# Altium footprint library Hare_Library.PcbLib: 252 footprints (part 14 of 16)
Each footprint in its own frame and in the unit in brackets; x right, y up, seen from the top. Pads: shape width x height; smd on the part's side, far side on the other; paste and mask are expansions set on the pad; w line width, h text height; cw(c..) or ccw(c..) is an arc to the next point about the centre after c.
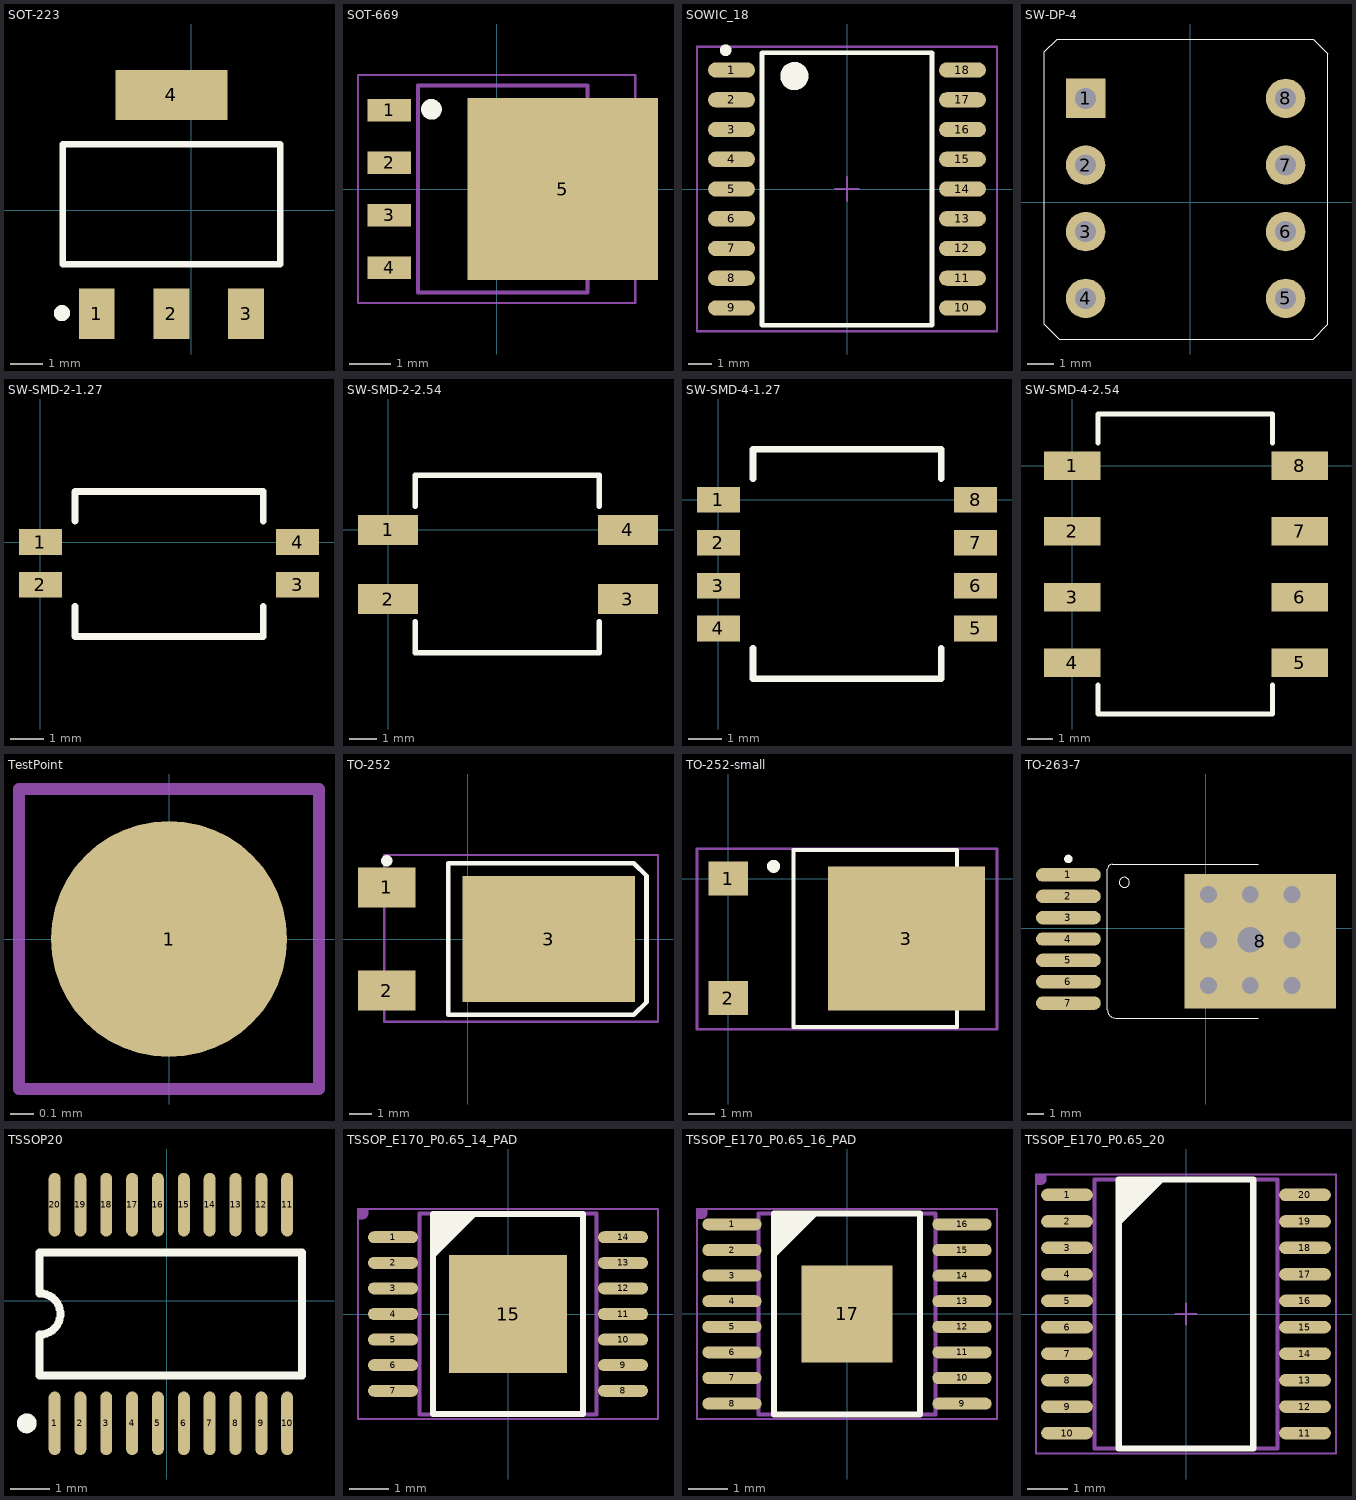
[diagram p13: the footprints below, top view; thin cyan lines are the x and y axes]

## SOT-223 [mm]
pads (4):
  rect 1.1x1.55 smd: 1(-2.91,-3.197) 2(-0.61,-3.197) 3(1.69,-3.197)
  rect 3.45x1.55 smd: 4(-0.61,3.553)
Top Overlay:
  circle w0.25: c-3.986,-3.175 r0.125
  lines w0.2: -3.96,-1.672 -3.96,2.028 2.74,2.028 2.74,-1.672 -3.96,-1.672
3D body "CircuitWorks-SOT-223.SLDPRT": height 1.7, standoff 0.02, extent -3.885,-3.378 2.615,3.582

## SOT-669 [mm] "DPAK, 4-Leads, Body 5x4.1mm, Pitch 1.27mm, IPC Medium Density"
height 1.2
pads (5):
  rect 1.05x0.55 smd: 1(-2.6,1.905) 2(-2.6,0.635) 3(-2.6,-0.635) 4(-2.6,-1.905)
  rect 4.6x4.4 smd: 5(1.6,0)
Top Overlay:
  circle w0.25: c-1.575,1.925 r0.125
Mechanical 13:
  lines w0.1: -1.9,-2.5 2.2,-2.5 2.2,2.5 -1.9,2.5 -1.9,-2.5
Mechanical 15:
  lines w0.05: -3.35,-2.75 3.35,-2.75 3.35,2.75 -3.35,2.75 -3.35,-2.75
  lines w0.1: -0.5,0 0.5,0 ; 0,-0.5 0,0.5
3D body "SOT669-CW.step": height 1.15, standoff -0.05, extent -2.878,-2.45 3.55,2.45

## SOWIC_18 [mm]
pads (18):
  oval 2x0.65 smd: 1(-4.933,5.08) 2(-4.933,3.81) 3(-4.933,2.54) 4(-4.933,1.27) 5(-4.933,0) 6(-4.933,-1.27) 7(-4.933,-2.54) 8(-4.933,-3.81) 9(-4.933,-5.08) 10(4.933,-5.08) 11(4.933,-3.81) 12(4.933,-2.54) 13(4.933,-1.27) 14(4.933,0) 15(4.933,1.27) 16(4.933,2.54) 17(4.933,3.81) 18(4.933,5.08)
Top Overlay:
  circle w0.6: c-2.25,4.825 r0.3
  circle w0.25: c-5.183,5.93 r0.125
  lines w0.2: -3.632,-5.825 -3.632,5.825 3.632,5.825 3.632,-5.825 -3.632,-5.825
Mechanical 15:
  lines w0.1: -0.5,0 0.5,0 ; 0,-0.5 0,0.5 ; -6.408,-6.075 -6.408,6.075 6.408,6.075 6.408,-6.075 -6.408,-6.075
3D body "SOIC-18-300.STEP": height 2.57, standoff -0.03, extent -5.3,-5.875 5.3,5.875

## SW-DP-4 [mm]
pads (8):
  rect 1.5x1.5 hole 0.8: 1(-3.98,3.96)
  round 1.5 hole 0.8: 2(-3.98,1.42) 3(-3.98,-1.12) 4(-3.98,-3.66) 5(3.64,-3.66) 6(3.64,-1.12) 7(3.64,1.42) 8(3.64,3.96)
Top Overlay:
  lines w0.025: -4.717,6.22 4.681,6.22 5.24,5.662 5.24,-4.651 4.681,-5.21 -4.996,-5.21 -5.555,-4.651 -5.555,5.738 -5.072,6.22 -4.488,6.22
3D body "User Library-DIPSWITCH4pts.SLDPRT": height 6.9, standoff -3.2, extent -5.309,-5.228 4.851,6.452

## SW-SMD-2-1.27 [mm]
pads (4):
  rect 1.27x0.76 smd: 1(0,0) 2(0,-1.27) 3(7.62,-1.27) 4(7.62,0)
Top Overlay:
  lines w0.2: 1.025,-1.9 1.025,-2.8 6.6,-2.8 6.6,-1.9 ; 1.025,0.625 1.025,1.5 6.6,1.5 6.6,0.625
3D body "DIP SW 2P 1.27.stp": height 2.1, standoff 0, extent -0.225,-2.44 7.775,1.14

## SW-SMD-2-2.54 [mm]
pads (4):
  rect 2.2x1.1 smd: 1(0,0) 2(0,-2.54) 3(8.8,-2.54) 4(8.8,0)
Top Overlay:
  lines w0.2: 1,-3.375 1,-4.5 7.75,-4.5 7.75,-3.375 ; 1,0.875 1,2 7.75,2 7.75,0.875
3D body "User Library-DIP SW 2P.STEP": height 4.15, standoff 0, extent -0.55,-4.55 9.35,2

## SW-SMD-4-1.27 [mm]
pads (8):
  rect 1.27x0.76 smd: 1(0,0) 2(0,-1.27) 3(0,-2.54) 4(0,-3.81) 5(7.62,-3.81) 6(7.62,-2.54) 7(7.62,-1.27) 8(7.62,0)
Top Overlay:
  lines w0.2: 1.025,-4.4 1.025,-5.3 6.6,-5.3 6.6,-4.4 ; 1.025,0.625 1.025,1.5 6.6,1.5 6.6,0.625
3D body "43610.stp": height 2.1, standoff 0, extent -0.2,-4.96 7.8,1.16

## SW-SMD-4-2.54 [mm]
pads (8):
  rect 2.2x1.1 smd: 1(0,0) 2(0,-2.54) 3(0,-5.08) 4(0,-7.62) 5(8.8,-7.62) 6(8.8,-5.08) 7(8.8,-2.54) 8(8.8,0)
Top Overlay:
  lines w0.2: 1,-8.475 1,-9.6 7.75,-9.6 7.75,-8.475 ; 1,0.875 1,2 7.75,2 7.75,0.875
3D body "DIP SW 4P.STEP": height 4.15, standoff 0, extent -0.55,-9.615 9.35,2.015

## TestPoint [mm]
height 4.3
pads (1):
  round 1 smd: 1(0,0)
Mechanical 13:
  lines w0.051: -0.635,-0.635 -0.635,0.635 0.635,0.635 0.635,-0.635 -0.635,-0.635
Mechanical 14:
  lines w0.051: -0.635,-0.635 0.635,-0.635 0.635,0.635 -0.635,0.635 -0.635,-0.635

## TO-252 [mm] "贴片MOS管"
pads (3):
  rect 2.54x1.778 smd: 1(-3.578,2.28) 2(-3.578,-2.28)
  rect 7.6x5.55 smd: 3(3.578,0)
Top Overlay:
  circle w0.25: c-3.578,3.455 r0.125
  lines w0.2: -0.867,-3.35 7.34,-3.35 7.896,-2.794 7.896,2.794 7.34,3.35 -0.867,3.35 -0.867,-3.35
Mechanical 15:
  lines w0.1: -3.683,-3.65 -3.683,3.708 8.404,3.708 8.404,-3.65 -3.683,-3.65
3D body "User Library-DPAK_TO-252AA.SLDPRT": height 2.37, standoff -0.03, extent -3.726,-3.335 6.374,3.399

## TO-252-small [mm] "贴片MOS管"
pads (3):
  rect 1.5x1.3 smd: 1(0,0) 2(0,-4.56)
  rect 6x5.5 smd: 3(6.8,-2.29)
Top Overlay:
  circle w0.25: c1.73,0.47 r0.125
  lines w0.154: 2.489,-5.664 8.738,-5.664 8.738,1.092 2.489,1.092 2.489,-5.664
Mechanical 14:
  lines w0.1: -1.195,-5.755 10.262,-5.755 10.262,1.145 -1.195,1.145 -1.195,-5.755
3D body "User Library-DPAK_TO-252AA.SLDPRT": height 2.37, standoff -0.03, extent -0.561,-5.653 9.539,1.081

## TO-263-7 [mm]
pads (8):
  oval 3.85x0.8 smd: 1(-8.178,3.185) 2(-8.178,1.915) 3(-8.178,0.645) 4(-8.178,-0.625) 5(-8.178,-1.895) 6(-8.178,-3.165) 7(-8.178,-4.435)
  rect 9x8 smd: 8(3.235,-0.752)
via 0.145,-3.393 diameter 2 hole 1
via 2.634,2.017 diameter 2 hole 1
via 2.634,-3.393 diameter 2 hole 1
via 5.123,2.017 diameter 2 hole 1
via 5.123,-3.393 diameter 2 hole 1
via 5.123,-0.676 diameter 2 hole 1
via 2.634,-0.676 diameter 2 hole 1.5
via 0.145,-0.676 diameter 2 hole 1
via 0.145,2.017 diameter 2 hole 1
Top Overlay:
  circle w0.25: c-8.178,4.135 r0.125
  circle w0.025: c-4.853,2.74 r0.3
  lines w0.025: -5.147,-5.324 -5.37,-5.324 ; 3.115,-5.324 -5.37,-5.324 ; 3.115,3.816 -5.247,3.816 -5.568,3.816 ccw(c-5.568,3.532) -5.853,3.532 -5.853,3.134 -5.853,-4.841 ccw(c-5.37,-4.841) -5.37,-5.324
3D body "User Library-7L TO-263 THIN.SLDPRT": height 2, standoff -0.01, extent -8.255,-5.69 5.755,4.47

## TSSOP20 [mm]
pads (20):
  oval 0.3x1.6 smd: 1(-2.823,-3.08) 2(-2.173,-3.08) 3(-1.523,-3.08) 4(-0.873,-3.08) 5(-0.223,-3.08) 6(0.427,-3.08) 7(1.077,-3.08) 8(1.727,-3.08) 9(2.377,-3.08) 10(3.027,-3.08) 11(3.027,2.42) 12(2.377,2.42) 13(1.727,2.42) 14(1.077,2.42) 15(0.427,2.42) 16(-0.223,2.42) 17(-0.873,2.42) 18(-1.523,2.42) 19(-2.173,2.42) 20(-2.823,2.42)
Top Overlay:
  circle w0.25: c-3.523,-3.08 r0.125
  lines w0.2: -3.198,-1.88 -3.198,-0.85 ccw(c-3.198,-0.33) -3.198,0.19 -3.198,1.22 3.402,1.22 3.402,-1.88 -3.198,-1.88
3D body "User Library-tssop-20-1.SLDPRT": height 1.2, standoff 0, extent -3.198,-3.706 3.402,2.894

## TSSOP_E170_P0.65_14_PAD [mil]
height 47.24
pads (15):
  oval 50x12 smd: 1(-115,76.77) 2(-115,51.18) 3(-115,25.59) 4(-115,0) 5(-115,-25.59) 6(-115,-51.18) 7(-115,-76.77) 8(115,-76.77) 9(115,-51.18) 10(115,-25.59) 11(115,0) 12(115,25.59) 13(115,51.18) 14(115,76.77)
  rect 118.11x118.11 smd: 15(0,0)
Top Overlay:
  region: -75,100.47 -30,100.47 -75,55.47
  lines w6: -75,-100 75,-100 75,100 -75,100 -75,-100
Mechanical 13:
  lines w2: -10,0 10,0 ; 0,-10 0,10
  lines w3.94: -88.58,-100.39 88.58,-100.39 88.58,100.39 -88.58,100.39 -88.58,-100.39
Mechanical 14:
  region: -150,105 -140,105 -140,100 -140,99.01 -140.76,97.17 -142.17,95.76 -144.01,95 -145,95 -150,95
  lines w2: -150,-105 -150,105 150,105 150,-105 -150,-105
3D body "User Library-tssop14-2.STEP": height 47.24, standoff 0, extent -125.98,-100.39 125.99,100.4

## TSSOP_E170_P0.65_16_PAD [mm]
height 1.2
pads (17):
  oval 1.5x0.305 smd: 1(-2.921,2.275) 2(-2.921,1.625) 3(-2.921,0.975) 4(-2.921,0.325) 5(-2.921,-0.325) 6(-2.921,-0.975) 7(-2.921,-1.625) 8(-2.921,-2.275) 9(2.921,-2.275) 10(2.921,-1.625) 11(2.921,-0.975) 12(2.921,-0.325) 13(2.921,0.325) 14(2.921,0.975) 15(2.921,1.625) 16(2.921,2.275)
  rect 2.31x2.46 smd: 17(0,0)
Top Overlay:
  region: -1.85,2.562 -0.707,2.562 -1.85,1.419
  lines w0.152: -1.85,-2.55 -1.85,2.55 1.85,2.55 1.85,-2.55 -1.85,-2.55
Mechanical 13:
  lines w0.051: -0.254,0 0.254,0 ; 0,-0.254 0,0.254
  lines w0.1: -2.25,-2.55 -2.25,2.55 2.25,2.55 2.25,-2.55 -2.25,-2.55
Mechanical 14:
  region: -3.81,2.667 -3.556,2.667 -3.556,2.54 -3.556,2.515 -3.575,2.468 -3.611,2.432 -3.658,2.413 -3.683,2.413 -3.81,2.413
  lines w0.051: -3.81,-2.667 -3.81,2.667 3.81,2.667 3.81,-2.667 -3.81,-2.667
3D body "User Library-tssop16-2.STEP": height 1.2, standoff 0, extent -3.2,-2.55 3.2,2.55

## TSSOP_E170_P0.65_20 [mil]
height 47.24
pads (20):
  oval 50x12 smd: 1(-115,115.16) 2(-115,89.57) 3(-115,63.98) 4(-115,38.39) 5(-115,12.8) 6(-115,-12.8) 7(-115,-38.39) 8(-115,-63.98) 9(-115,-89.57) 10(-115,-115.16) 11(115,-115.16) 12(115,-89.57) 13(115,-63.98) 14(115,-38.39) 15(115,-12.8) 16(115,12.8) 17(115,38.39) 18(115,63.98) 19(115,89.57) 20(115,115.16)
Top Overlay:
  region: -65,130 -20,130 -65,85
  lines w6: -65,-130 65,-130 65,130 -65,130 -65,-130
Mechanical 13:
  lines w2: -10,0 10,0 ; 0,-10 0,10
  lines w3.94: -88.58,-129.92 88.58,-129.92 88.58,129.92 -88.58,129.92 -88.58,-129.92
Mechanical 14:
  region: -145,135 -135,135 -135,130 -135,129.01 -135.76,127.17 -137.17,125.76 -139.01,125 -140,125 -145,125
  lines w2: -145,-135 -145,135 145,135 145,-135 -145,-135
3D body "User Library-TSSOP-20 6_6x4_4.STEP": height 41.69, standoff -1.62, extent -125.98,-129.91 125.99,129.93